# Altium footprint library PCB-Tester-Board.PcbLib: 70 footprints (part 3 of 5)
Each footprint in its own frame and in the unit in brackets; x right, y up, seen from the top. Pads: shape width x height; smd on the part's side, far side on the other; paste and mask are expansions set on the pad; w line width, h text height; cw(c..) or ccw(c..) is an arc to the next point about the centre after c.
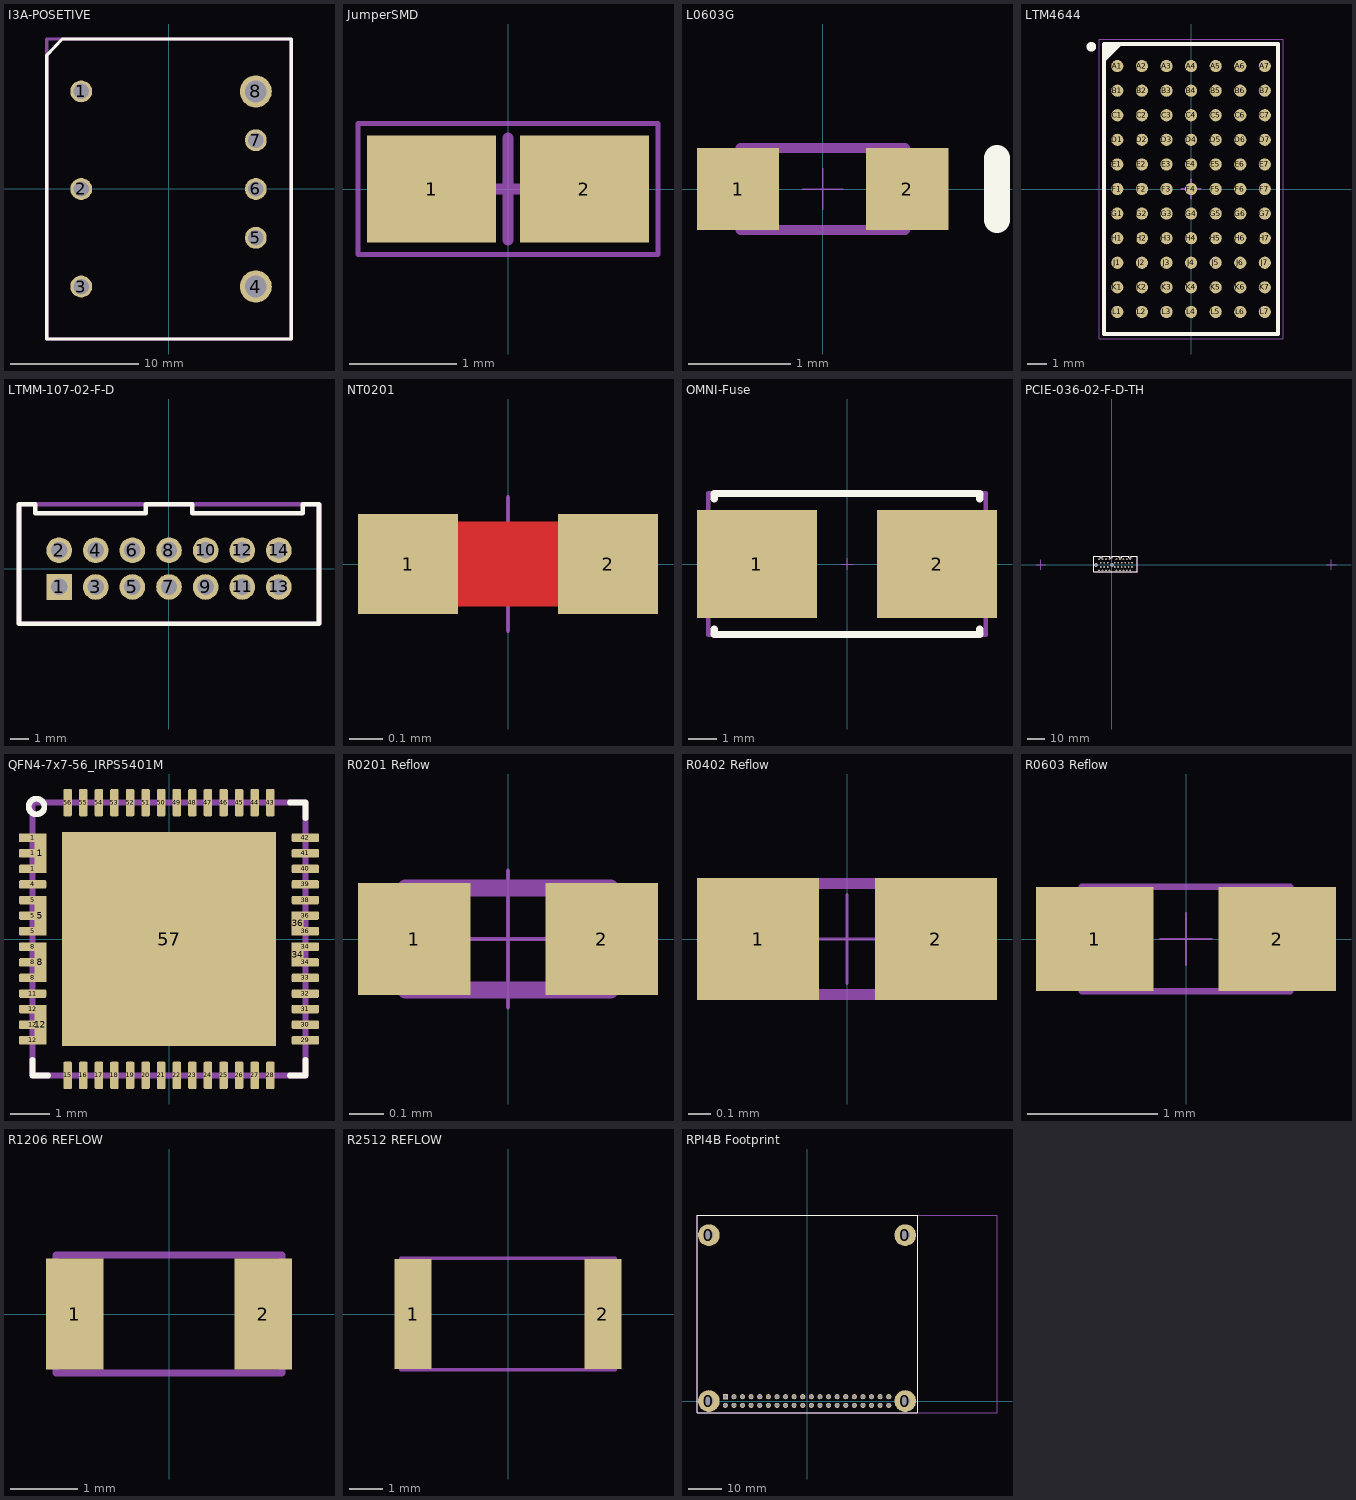
[diagram p2: the footprints below, top view; thin cyan lines are the x and y axes]

## I3A-POSETIVE [mm]
pads (8):
  round 1.7 hole 1.2 paste+0: 1(-6.8,7.6) 2(-6.8,0) 3(-6.8,-7.6) 5(6.8,-3.8) 6(6.8,0) 7(6.8,3.8)
  round 2.5 hole 1.7 paste+0: 4(6.8,-7.6) 8(6.8,7.6)
Top Overlay:
  lines w0.254: -9.487,-11.684 9.563,-11.684 9.563,11.684 -8.293,11.684 -9.487,10.414 -9.487,-11.684
Top Courtyard:
  lines w0.254: 9.563,-11.684 -9.487,-11.684 -9.487,11.684 9.563,11.684 9.563,-11.684 ; 9.563,-11.684 9.563,-11.684
3D body "i3a.STEP": height 9.54, standoff -3.68, extent -9.487,-11.684 9.563,11.684

## JumperSMD [mm] "Chip Resistor, Body 1.6x0.8mm (LxW typ), IPC High Density"
height 10
pads (2):
  rect 1.2x1 smd: 1(-0.711,0) 2(0.711,0)
Top Courtyard:
  lines w0.05: -1.397,-0.61 1.397,-0.61 1.397,0.61 -1.397,0.61 -1.397,-0.61
Mechanical 17:
  lines w0.1: -0.475,0 0.475,0 ; 0,-0.475 0,0.475 0,-0.475
3D body "R0603.STEP": height 0.45, standoff 0, extent -0.889,-0.4 0.711,0.4

## L0603G [mm] "LTST-C191KGKT"
pads (2):
  rect 0.8x0.8 smd: 1(-0.825,0) 2(0.825,0)
Top Overlay:
  lines w0.254: 1.7,-0.3 1.7,0.3
Top Courtyard:
  lines w0.1: -0.8,-0.4 -0.8,0.4 0.8,0.4 0.8,-0.4 -0.8,-0.4
Mechanical 17:
  lines w0.013: -0.2,0 0.2,0 ; 0,-0.2 0,0.2
3D body "L0603G.STEP": height 0.8, standoff 0, extent -0.8,-0.4 0.8,0.4

## LTM4644 [mm]
height 5.21
pads (77):
  round 0.63 smd: A1(-3.81,6.35) A2(-2.54,6.35) A3(-1.27,6.35) A4(0,6.35) A5(1.27,6.35) A6(2.54,6.35) A7(3.81,6.35) B1(-3.81,5.08) B2(-2.54,5.08) B3(-1.27,5.08) B4(0,5.08) B5(1.27,5.08) B6(2.54,5.08) B7(3.81,5.08) C1(-3.81,3.81) C2(-2.54,3.81) C3(-1.27,3.81) C4(0,3.81) C5(1.27,3.81) C6(2.54,3.81) C7(3.81,3.81) D1(-3.81,2.54) D2(-2.54,2.54) D3(-1.27,2.54) D4(0,2.54) D5(1.27,2.54) D6(2.54,2.54) D7(3.81,2.54) E1(-3.81,1.27) E2(-2.54,1.27) E3(-1.27,1.27) E4(0,1.27) E5(1.27,1.27) E6(2.54,1.27) E7(3.81,1.27) F1(-3.81,0) F2(-2.54,0) F3(-1.27,0) F4(0,0) F5(1.27,0) F6(2.54,0) F7(3.81,0) G1(-3.81,-1.27) G2(-2.54,-1.27) G3(-1.27,-1.27) G4(0,-1.27) G5(1.27,-1.27) G6(2.54,-1.27) G7(3.81,-1.27) H1(-3.81,-2.54) H2(-2.54,-2.54) H3(-1.27,-2.54) H4(0,-2.54) H5(1.27,-2.54) H6(2.54,-2.54) H7(3.81,-2.54) J1(-3.81,-3.81) J2(-2.54,-3.81) J3(-1.27,-3.81) J4(0,-3.81) J5(1.27,-3.81) J6(2.54,-3.81) J7(3.81,-3.81) K1(-3.81,-5.08) K2(-2.54,-5.08) K3(-1.27,-5.08) K4(0,-5.08) K5(1.27,-5.08) K6(2.54,-5.08) K7(3.81,-5.08) L1(-3.81,-6.35) L2(-2.54,-6.35) L3(-1.27,-6.35) L4(0,-6.35) L5(1.27,-6.35) L6(2.54,-6.35) L7(3.81,-6.35)
Top Overlay:
  circle w0.25: c-5.15,7.35 r0.125
  region: -3.671,7.5 -4.5,6.671 -4.5,7.5
  lines w0.2: -4.5,6.671 -3.671,7.5 ; -4.5,-7.5 -4.5,7.5 4.5,7.5 4.5,-7.5 -4.5,-7.5
Top Component Outline:
  lines w0.1: -4.5,-7.5 4.5,-7.5 4.5,7.5 -4.5,7.5 -4.5,-7.5
Top Courtyard:
  lines w0.05: -4.75,-7.75 -4.75,7.75 4.75,7.75 4.75,-7.75 -4.75,-7.75
Mechanical 17:
  lines w0.1: -0.5,0 0.5,0 ; 0,-0.5 0,0.5
3D body "LTM4644.STEP": height 5.11, standoff 0, extent -4.5,-7.5 4.5,7.5

## LTMM-107-02-F-D [mm] "CONN HEADER VERT 14POS 2MM (Xilinx JTAG)"
pads (14):
  rect 1.4x1.4 hole 0.9 paste+0: 1(-6,-1)
  round 1.4 hole 0.9 paste+0: 2(-6,1) 3(-4,-1) 4(-4,1) 5(-2,-1) 6(-2,1) 7(0,-1) 8(0,1) 9(2,-1) 10(2,1) 11(4,-1) 12(4,1) 13(6,-1) 14(6,1)
Top Overlay:
  lines w0.254: -8.191,-3.015 -8.191,3.523 -7.3,3.523 -7.3,3.023 -1.27,3.023 -1.27,3.523 1.27,3.523 1.27,3.023 7.3,3.023 7.3,3.523 8.191,3.523 8.191,-3.015 -8.191,-3.015
Top Courtyard:
  lines w0.254: -8.191,-3.015 -8.191,3.523 8.191,3.523 8.191,-3.015 -8.191,-3.015
3D body "LTMM-107-02-F-D.STEP": height 4.83, standoff -2.97, extent -8.191,-3.015 8.191,3.523

## NT0201 [mm] "10 mil"
pads (2):
  rect 0.3x0.3 smd paste-1: 1(-0.3,0) 2(0.3,0)
Top Layer:
  lines w0.254: -0.3,0 0.3,0
Mechanical 17:
  lines w0.013: -0.2,0 0.2,0 ; 0,-0.2 0,0.2

## OMNI-Fuse [mm] "SMD2 Fuse Clip"
pads (2):
  rect 4.24x3.81 smd: 1(-3.19,0) 2(3.19,0)
Top Overlay:
  lines w0.254: -4.7,-2.3 -4.7,-2.5 4.7,-2.5 4.7,-2.3 ; -4.7,2.3 -4.7,2.5 4.7,2.5 4.7,2.3
Top Courtyard:
  lines w0.152: -4.915,-2.515 4.915,-2.515 4.915,2.515 -4.915,2.515 -4.915,-2.515
Mechanical 17:
  lines w0.013: -0.2,0 0.2,0 ; 0,-0.2 0,0.2
3D body "OMNI-block.STEP": height 3.81, standoff 0, extent -4.915,-2.515 4.915,2.515

## PCIE-036-02-F-D-TH [mm] "CONN PCI EXP FMALE 36POS 0.039"
pads (38):
  round 1 hole 2.35 unplated paste-2: 0(-9.15,0) 0(0,0)
  round 1 hole 0.7 paste-2: A1(11.65,-1.25) A2(10.65,-3.25) A3(9.65,-1.25) A4(8.65,-3.25) A5(7.65,-1.25) A6(6.65,-3.25) A7(5.65,-1.25) A8(4.65,-3.25) A9(3.65,-1.25) A10(2.65,-3.25) A11(1.65,-1.25) A12(-1.35,-3.25) A13(-2.35,-1.25) A14(-3.35,-3.25) A15(-4.35,-1.25) A16(-5.35,-3.25) A17(-6.35,-1.25) A18(-7.35,-3.25) B1(11.65,1.25) B2(10.65,3.25) B3(9.65,1.25) B4(8.65,3.25) B5(7.65,1.25) B6(6.65,3.25) B7(5.65,1.25) B8(4.65,3.25) B9(3.65,1.25) B10(2.65,3.25) B11(1.65,1.25) B12(-1.35,3.25) B13(-2.35,1.25) B14(-3.35,3.25) B15(-4.35,1.25) B16(-5.35,3.25) B17(-6.35,1.25) B18(-7.35,3.25)
Top Overlay:
  lines w0.254: -10.359,-4.1 14.641,-4.1 14.641,5.05 11.091,5.05 11.091,4.1 9.691,4.1 9.691,5.05 5.591,5.05 5.591,4.1 4.191,4.1 4.191,5.05 0.091,5.05 0.091,4.1 -1.309,4.1 -1.309,5.05 -5.409,5.05 -5.409,4.1 -6.809,4.1 -6.809,5.05 -10.359,5.05 -10.359,-4.1
Top Courtyard:
  lines w0.254: -10.359,-4.1 14.641,-4.1 14.641,5.05 -10.359,5.05 -10.359,-4.1
Mechanical 17:
  lines w0.254: -43.662,0 -37.978,0 ; -40.822,-2.845 -40.822,2.845 ; 123.338,0 129.022,0 ; 126.178,-2.845 126.178,2.845
3D body "PCIE-036-02-F-D-TH.STEP": height 11.01, standoff -4.39, extent -10.359,-3.65 14.641,5.05

## QFN4-7x7-56_IRPS5401M [mm] "QFN, 7x7mm, 56 pins, pitch 0.4mm, IRPS5401 version"
height 1
pads (63):
  rrect33% 0.7x0.22 smd: 1(-3.5,1.8) 1(-3.5,2.2) 4(-3.5,1.4) 5(-3.5,0.2) 5(-3.5,0.6) 5(-3.5,1) 8(-3.5,-1) 8(-3.5,-0.6) 8(-3.5,-0.2) 11(-3.5,-1.4) 12(-3.5,-2.6) 12(-3.5,-2.2) 12(-3.5,-1.8) 29(3.5,-2.6) 30(3.5,-2.2) 31(3.5,-1.8) 32(3.5,-1.4) 33(3.5,-1) 34(3.5,-0.6) 34(3.5,-0.2) 36(3.5,0.2) 36(3.5,0.6) 38(3.5,1) 39(3.5,1.4) 40(3.5,1.8) 41(3.5,2.2) 42(3.5,2.6)
  rect 0.7x0.22 smd: 1(-3.5,2.6)
  rect 0.31x1.02 smd: 1(-3.3,2.2) 5(-3.3,0.6) 8(-3.3,-0.6) 12(-3.3,-2.2)
  rrect33% 0.22x0.7 smd: 15(-2.6,-3.5) 16(-2.2,-3.5) 17(-1.8,-3.5) 18(-1.4,-3.5) 19(-1,-3.5) 20(-0.6,-3.5) 21(-0.2,-3.5) 22(0.2,-3.5) 23(0.6,-3.5) 24(1,-3.5) 25(1.4,-3.5) 26(1.8,-3.5) 27(2.2,-3.5) 28(2.6,-3.5) 43(2.6,3.5) 44(2.2,3.5) 45(1.8,3.5) 46(1.4,3.5) 47(1,3.5) 48(0.6,3.5) 49(0.2,3.5) 50(-0.2,3.5) 51(-0.6,3.5) 52(-1,3.5) 53(-1.4,3.5) 54(-1.8,3.5) 55(-2.2,3.5) 56(-2.6,3.5)
  rect 0.31x0.62 smd: 34(3.3,-0.4) 36(3.3,0.4)
  rect 5.5x5.5 smd: 57(0,0)
Top Overlay:
  circle w0.15: c-3.4,3.4 r0.2
  lines w0.15: -3.5,-3.1 -3.5,-3.5 -3.1,-3.5 ; 3.1,-3.5 3.5,-3.5 3.5,-3.1 ; 3.1,3.5 3.5,3.5 3.5,3.1
Top Courtyard:
  lines w0.15: -3.5,-3.5 -3.5,3.5 3.5,3.5 3.5,-3.5 -3.5,-3.5
3D body: height 1, standoff 0, extent -3.5,-3.5 3.5,3.5
3D body: height 1, standoff 1, extent -3.248,2.751 -2.75,3.25

## R0201 Reflow [mm] "SMT Resistor 0201 Reflow Soldering"
pads (2):
  rect 0.33x0.33 smd: 1(-0.275,0) 2(0.275,0)
Top Solder:
  rectangle: -0.27,-0.267 0.238,0.267
Top Courtyard:
  lines w0.05: -0.3,-0.15 -0.3,0.15 0.3,0.15 0.3,-0.15 -0.3,-0.15
Mechanical 17:
  lines w0.013: -0.2,0 0.2,0 ; 0,-0.2 0,0.2
3D body "R0201.STEP": height 0.23, standoff 0, extent -0.3,-0.15 0.3,0.15

## R0402 Reflow [mm] "SMT Resistor 0402 Reflow Soldering"
pads (2):
  rect 0.55x0.55 smd: 1(-0.4,0) 2(0.4,0)
Top Solder:
  rectangle: -0.3,-0.377 0.3,0.377
Top Courtyard:
  lines w0.05: -0.5,-0.25 0.5,-0.25 0.5,0.25 -0.5,0.25 -0.5,-0.25
Mechanical 17:
  lines w0.013: -0.2,0 0.2,0 ; 0,-0.2 0,0.2
3D body "R0402.STEP": height 0.35, standoff 0, extent -0.5,-0.25 0.5,0.25

## R0603 Reflow [mm] "SMT Resistor 0603 Reflow Soldering"
pads (2):
  rect 0.9x0.8 smd: 1(-0.7,0) 2(0.7,0)
Top Courtyard:
  lines w0.05: -0.8,-0.4 -0.8,0.4 0.8,0.4 0.8,-0.4 -0.8,-0.4
Mechanical 17:
  lines w0.013: -0.2,0 0.2,0 ; 0,-0.2 0,0.2
3D body "R0603.STEP": height 0.45, standoff 0, extent -0.8,-0.4 0.8,0.4

## R1206 REFLOW [mm] "Chip Resistor, Body 3.2x1.6mm (LxW typ), IPC High Density"
height 0.71
pads (2):
  rect 0.85x1.65 smd: 1(-1.4,0) 2(1.4,0)
Top Courtyard:
  lines w0.1: -1.675,-0.875 -1.675,0.875 1.675,0.875 1.675,-0.875 -1.675,-0.875
3D body: height 0.71, standoff 0, extent -1.675,-0.875 1.675,0.875

## R2512 REFLOW [mm] "Chip Resistor, Body 6.3x3.2mm (LxW typ), IPC High Density"
height 0.71
pads (2):
  rect 1.1x3.3 smd: 1(-2.85,0) 2(2.85,0)
Top Courtyard:
  lines w0.1: -3.225,-1.675 -3.225,1.675 3.225,1.675 3.225,-1.675 -3.225,-1.675
3D body: height 0.71, standoff 0, extent -3.225,-1.675 3.225,1.675

## RPI4B [mm] "Raspberry Pi 4B"
3D body "RPI4B.STEP": height 19.79, standoff -0.11, extent -32.5,-3.5 56.49,54.9

## RPI4B Footprint [mm] "Footprint for Raspberry Pi 4B"
pads (44):
  round 6.4 hole 2.7 unplated paste-6.5: 0(-29,0) 0(-29,49) 0(29,0) 0(29,49)
  rect 1.5x1.5 hole 1.1 paste-2: 1(-24.13,1.27)
  round 1.5 hole 1.1 paste-2: 2(-24.13,-1.27) 3(-21.59,1.27) 4(-21.59,-1.27) 5(-19.05,1.27) 6(-19.05,-1.27) 7(-16.51,1.27) 8(-16.51,-1.27) 9(-13.97,1.27) 10(-13.97,-1.27) 11(-11.43,1.27) 12(-11.43,-1.27) 13(-8.89,1.27) 14(-8.89,-1.27) 15(-6.35,1.27) 16(-6.35,-1.27) 17(-3.81,1.27) 18(-3.81,-1.27) 19(-1.27,1.27) 20(-1.27,-1.27) 21(1.27,1.27) 22(1.27,-1.27) 23(3.81,1.27) 24(3.81,-1.27) 25(6.35,1.27) 26(6.35,-1.27) 27(8.89,1.27) 28(8.89,-1.27) 29(11.43,1.27) 30(11.43,-1.27) 31(13.97,1.27) 32(13.97,-1.27) 33(16.51,1.27) 34(16.51,-1.27) 35(19.05,1.27) 36(19.05,-1.27) 37(21.59,1.27) 38(21.59,-1.27) 39(24.13,1.27) 40(24.13,-1.27)
Top Overlay:
  lines w0.254: -32.5,-3.5 32.5,-3.5 32.5,54.9 -32.5,54.9 -32.5,-3.5
Top Courtyard:
  lines w0.254: -32.5,-3.5 -32.5,54.9 56.1,54.9 56.1,-3.5 -32.5,-3.5
Mechanical 17:
  circle w0.013: c24.13,-1.27 r0.525
  circle w0.013: c16.51,1.27 r0.525
  circle w0.013: c11.43,1.27 r0.525
  circle w0.013: c8.89,1.27 r0.525
  circle w0.013: c8.89,-1.27 r0.525
  circle w0.013: c6.35,1.27 r0.525
  circle w0.013: c6.35,-1.27 r0.525
  circle w0.013: c3.81,-1.27 r0.525
  circle w0.013: c1.27,1.27 r0.525
  circle w0.013: c1.27,-1.27 r0.525
  circle w0.013: c-1.27,1.27 r0.525
  circle w0.013: c-1.27,-1.27 r0.525
  circle w0.013: c-3.81,1.27 r0.525
  circle w0.013: c-3.81,-1.27 r0.525
  circle w0.013: c-6.35,1.27 r0.525
  circle w0.013: c-6.35,-1.27 r0.525
  circle w0.013: c-8.89,1.27 r0.525
  circle w0.013: c-8.89,-1.27 r0.525
  circle w0.013: c-11.43,1.27 r0.525
  circle w0.013: c-11.43,-1.27 r0.525
  circle w0.013: c-13.97,1.27 r0.525
  circle w0.013: c-16.51,1.27 r0.525
  circle w0.013: c-16.51,-1.27 r0.525
  circle w0.013: c-19.05,1.27 r0.525
  circle w0.013: c-19.05,-1.27 r0.525
  circle w0.013: c-21.59,1.27 r0.525
  circle w0.013: c-21.59,-1.27 r0.525
  circle w0.013: c-24.13,1.27 r0.525
  circle w0.013: c-24.13,-1.27 r0.525
  circle w0.013: c-29,49 r1.35
  circle w0.013: c29,49 r1.35
  circle w0.013: c29,0 r1.35
  circle w0.013: c-29,0 r1.35
  circle w0.013: c-13.97,-1.27 r0.525
  circle w0.013: c3.81,1.27 r0.525
  circle w0.013: c11.43,-1.27 r0.525
  circle w0.013: c13.97,-1.27 r0.525
  circle w0.013: c13.97,1.27 r0.525
  circle w0.013: c16.51,-1.27 r0.525
  circle w0.013: c19.05,-1.27 r0.525
  circle w0.013: c19.05,1.27 r0.525
  circle w0.013: c21.59,-1.27 r0.525
  circle w0.013: c21.59,1.27 r0.525
  circle w0.013: c24.13,1.27 r0.525
3D body "ESW-120-23-L-D-LL.STEP": height 13.59, standoff -4.83, extent -25.654,-2.54 25.654,2.54